# Altium footprint library smdComponent.PcbLib: 182 footprints (part 11 of 12)
Each footprint in its own frame and in the unit in brackets; x right, y up, seen from the top. Pads: shape width x height; smd on the part's side, far side on the other; paste and mask are expansions set on the pad; w line width, h text height; cw(c..) or ccw(c..) is an arc to the next point about the centre after c.
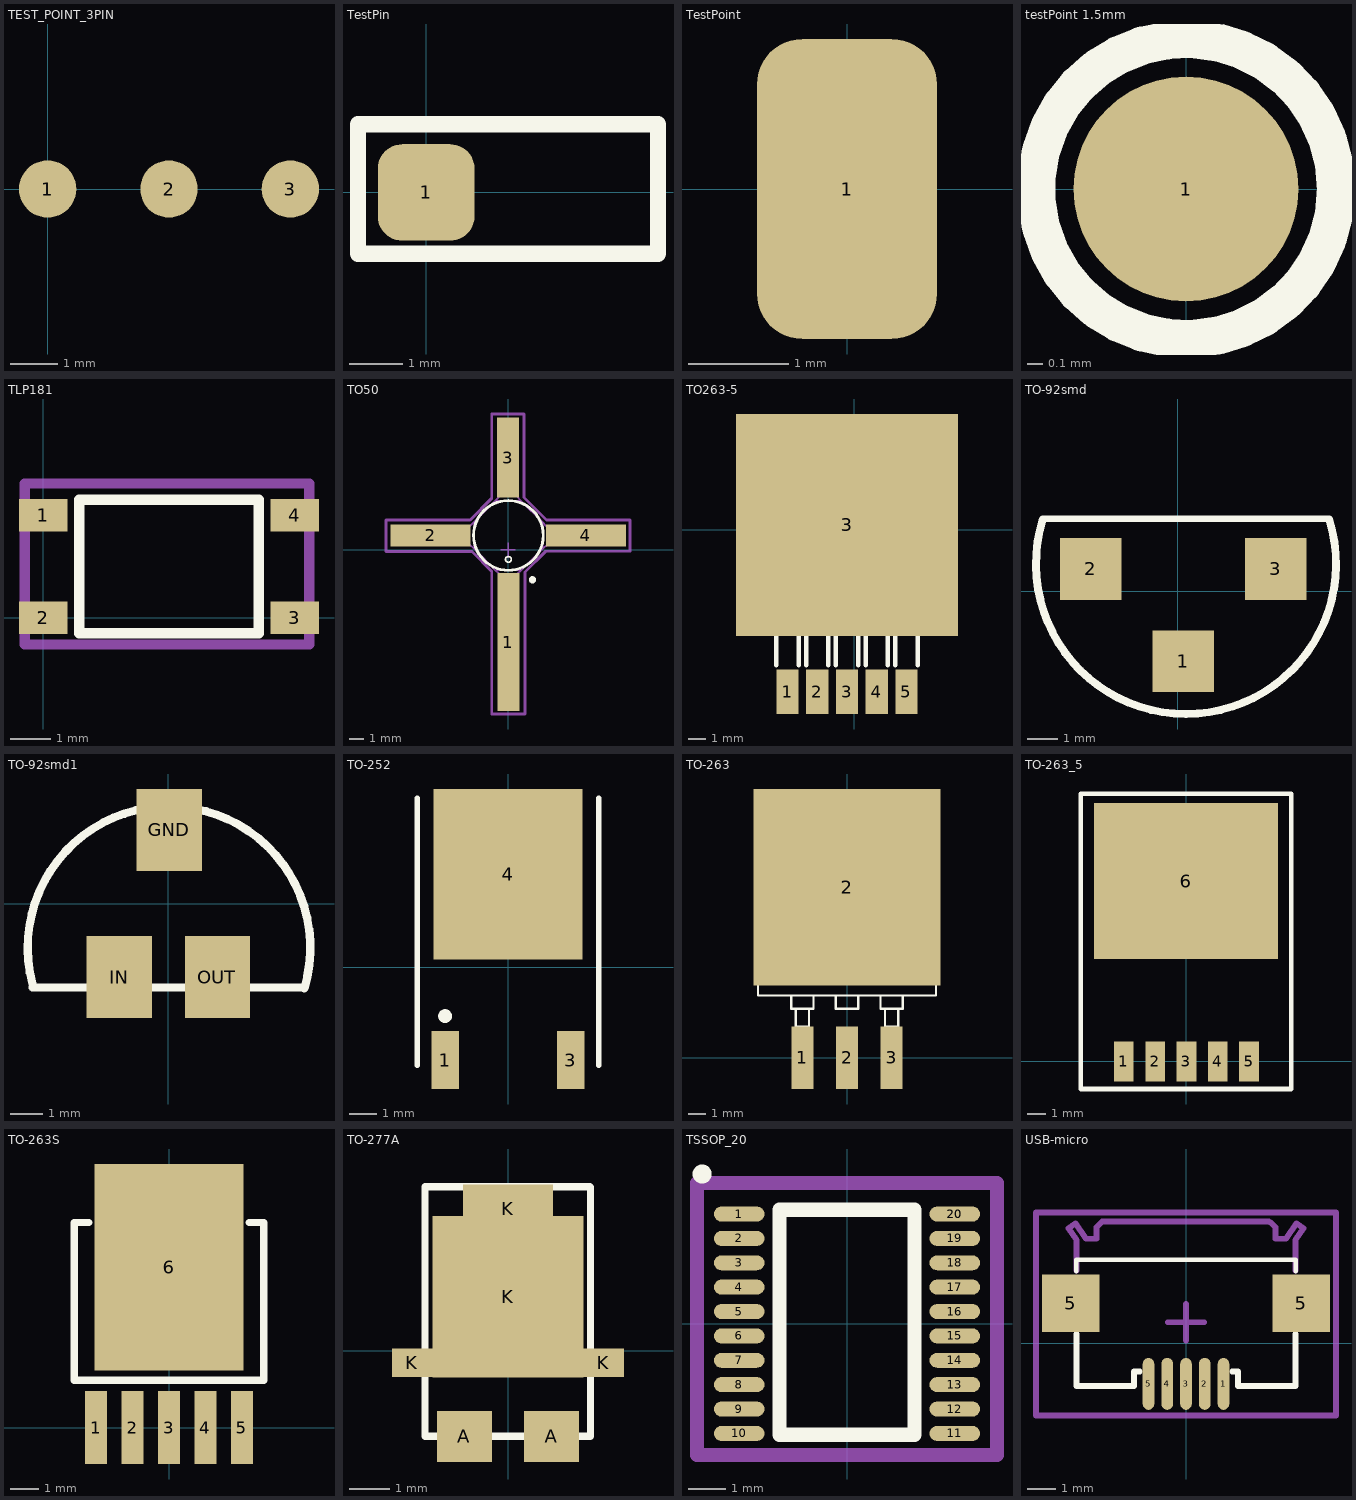
[diagram p10: the footprints below, top view; thin cyan lines are the x and y axes]

## TEST_POINT_3PIN [mm]
pads (3):
  round 1.2 smd: 1(0,0) 2(2.54,0) 3(5.08,0)

## TestPin [mm]
pads (1):
  rrect50% 1.8x1.8 smd: 1(0,0)
Top Overlay:
  lines w0.305: -1.27,-1.143 4.318,-1.143 4.318,1.27 -1.27,1.27 -1.27,-1.143
  text ".Comment" at 1.27,-0.254 h0.76

## TestPoint [mm]
pads (1):
  rrect50% 1.8x3 smd: 1(0,0)

## testPoint 1.5mm [mm]
pads (1):
  round 1.5 smd: 1(0,0)
Top Overlay:
  circle w0.254: c0,0 r1

## TLP181 [mm]
pads (4):
  rect 1.2x0.8 smd: 1(0,2.54) 2(0,0) 3(6.223,0) 4(6.223,2.54)
Top Overlay:
  lines w0.254: 0.889,-0.381 5.334,-0.381 5.334,2.921 0.889,2.921 0.889,-0.381
Mechanical 15:
  lines w0.254: -0.457,-0.66 -0.457,3.327 6.579,3.327 6.579,-0.66 -0.457,-0.66
3D body "User Library-PS2701_optocoupler.step": height 1.89, standoff -0.02, extent -0.427,-0.704 6.573,3.296

## TO50 [mm] "ERA, 4-Leads, Body 20.7x16.8mm,  Pitch 10.7mm"
height 2.5
pads (4):
  rect 1.5x9.5 smd: 1(0.013,-6.35)
  rect 5.5x1.5 smd: 2(-5.347,0.991) 4(5.347,0.991)
  rect 1.5x5.5 smd: 3(-0.013,6.35)
Top Overlay:
  circle w0.25: c1.669,-2.065 r0.125
  circle w0.1: c0.013,-0.66 r0.2
  circle w0.2: c0.013,0.991 r2.4
Mechanical 13:
  lines w0.1: -2.349,1.854 -2.349,0.076 ; -2.349,0.076 -0.876,-1.397 ; -2.349,0.076 -2.629,0.356 -7.07,0.356 -5.8,1.626 -2.654,1.626 -0.902,3.378 ; -0.902,3.378 0.876,3.378 ; -0.902,3.378 -0.66,3.619 -0.66,6.842 0.61,8.112 0.61,3.645 0.876,3.378 ; -0.876,-1.397 0.902,-1.397 ; -0.876,-1.397 -0.61,-1.664 -0.61,-10.13 0.635,-8.886 0.635,-1.664 0.902,-1.397 ; 0.876,3.378 2.375,1.88 ; 0.902,-1.397 2.4,0.102 2.426,0.102 ; 2.375,1.88 2.375,0.102 2.426,0.102 ; 2.375,1.88 2.629,1.626 7.426,1.626 7.426,0.356 2.68,0.356 2.426,0.102
Mechanical 15:
  lines w0.1: -0.5,0 0.5,0 ; 0,-0.5 0,0.5
  lines w0.2: -8.42,-0.127 -2.489,-0.127 -1.13,-1.486 -1.13,-2.083 -1.13,-11.303 1.156,-11.303 1.156,-1.537 2.591,-0.102 8.395,-0.102 8.395,2.057 2.629,2.057 1.079,3.607 1.079,9.347 -1.13,9.347 -1.13,3.543 -2.616,2.057 -8.42,2.057 -8.42,-0.127
3D body: height 2.5, standoff 0, extent -2.387,-1.409 2.412,3.39
3D body: height 1, standoff 0, extent 2.377,0.356 7.427,1.626
3D body: height 1, standoff 0, extent -0.61,-10.13 0.635,-1.397
3D body: height 1, standoff 0, extent -7.07,0.356 -2.349,1.626
3D body: height 1, standoff 0, extent -0.66,3.378 0.61,8.112
3D body: height 2.6, standoff 2.4, extent -0.187,-0.86 0.212,-0.461

## TO263-5 [mm]
pads (6):
  rect 1.27x2.54 smd: 1(-3.818,-9.27) 2(-2.116,-9.27) 3(-0.414,-9.27) 4(1.287,-9.27) 5(2.989,-9.27)
  rect 12.7x12.7 smd: 3(-0.414,0.28)
Top Overlay:
  lines w0.254: -4.453,-7.746 -4.453,-5.866 ; -3.183,-7.746 -3.183,-5.866 ; -2.751,-7.746 -2.751,-5.866 ; -1.481,-7.746 -1.481,-5.866 ; -1.049,-7.746 -1.049,-5.866 ; 0.221,-7.746 0.221,-5.866 ; 0.652,-7.746 0.652,-5.866 ; 1.922,-7.746 1.922,-5.866 ; 2.354,-7.746 2.354,-5.866 ; 3.624,-7.746 3.624,-5.866 ; -5.812,-5.866 4.983,-5.866 ; -5.812,-5.866 -5.812,4.548 ; -5.812,-5.866 -5.406,-5.46 ; -5.812,4.548 -5.812,5.36 -3.818,5.97 2.989,5.97 4.983,5.36 4.983,4.548 ; -5.812,4.548 -5.406,3.938 ; -5.812,4.548 4.983,4.548 ; -5.406,-5.46 4.577,-5.46 ; -5.406,-5.46 -5.406,3.938 ; -5.406,3.938 4.577,3.938 ; 4.577,-5.46 4.577,3.938 ; 4.577,-5.46 4.983,-5.866 ; 4.577,3.938 4.983,4.548 ; 4.983,-5.866 4.983,4.548
  text "1" at -4.074,-4.932 h0.89
  text "5" at 2.733,-4.932 h0.89
3D body "TO263-5S.STEP": height 4.81, standoff 0.01, extent -5.436,-10.045 4.564,5.625

## TO-92smd [mm]
pads (3):
  rect 2x2 smd: 1(0.178,-2.279) 2(-2.822,0.721) 3(3.178,0.721)
Top Overlay:
  lines w0.2: -4.382,2.351 4.918,2.351
  lines w0.254: -4.382,2.331 ccw(c0.267,0.882) 4.918,2.326

## TO-92smd1 [mm]
pads (3):
  rect 2x2.5 smd: GND(0.024,2.25) IN(-1.5,-2.25) OUT(1.5,-2.25)
Top Overlay:
  lines w0.254: -4.154,-2.565 4.157,-2.565 ; -4.154,-2.463 cw(c0.019,-1.35) 4.157,-2.585

## TO-252 [mm] "for LM7805CDT-smd"
pads (3):
  rect 1x2.1 smd: 1(-2.285,-3.375) 3(2.285,-3.375)
  rect 5.4x6.2 smd: 4(0,3.375)
Top Overlay:
  circle w0.25: c-2.285,-1.775 r0.125
  lines w0.2: -3.29,-3.568 -3.29,6.132 ; 3.29,-3.568 3.29,6.132
3D body "CircuitWorks-TO-252.step": height 2.3, standoff 0, extent -3.29,-3.568 3.29,6.132

## TO-263 [mil]
pads (4):
  rect 50x140 smd: 1(-100,0) 2(0,0) 3(100,0)
  rect 420x440.94 smd: 2(0,382.83)
Top Overlay:
  lines w5: -125,140 -125,110 -75,110 -75,140 ; -115,110 -115,70 -85,70 -85,110 ; -25,140 -25,110 25,110 25,140 ; 75,140 75,110 125,110 125,140 ; 85,110 85,70 115,70 115,110 ; -200,140 -200,520 -200,550 -170,565 170,565 200,550 200,520 200,140 -200,140
3D body "SW3dPS-TO263-3S.STEP": height 189.36, standoff 0.39, extent -195.21,-43.32 198.49,573.61

## TO-263_5 [mm]
pads (6):
  rect 1.07x2.16 smd: 1(-3.4,0) 2(-1.7,0) 3(0,0) 4(1.7,0) 5(3.4,0)
  rect 10x8.5 smd: 6(-0.025,9.804)
Top Overlay:
  lines w0.254: -5.74,-1.499 -5.74,14.554 5.69,14.554 5.69,-1.499 -5.74,-1.499
3D body "TO263-5S.STEP": height 4.81, standoff 0.01, extent -5.025,-1.064 4.975,14.606

## TO-263S [mil]
pads (6):
  rect 30x100 smd: 1(-100,0) 2(-50,0) 3(0,0) 4(50,0) 5(100,0)
  rect 204.72x283.46 smd: 6(0,220)
Top Overlay:
  lines w10: -109.92,281.54 -129.92,281.54 -129.92,65 129.92,65 129.92,281.54 109.92,281.54

## TO-277A [mm]
pads (6):
  rect 1.35x1.24 smd: A(-1.065,-2.096) A(1.065,-2.096)
  rect 1x0.7 smd: K(-2.337,-0.291) K(2.337,-0.291)
  rect 3.7x3.94 smd: K(0,1.321)
  rect 2.2x1.2 smd: K(0,3.468)
Top Overlay:
  lines w0.178: -2.032,4.013 -2.032,-2.092 2.018,-2.092 2.018,4.002 2.007,4.013 -1.981,4.013

## TSSOP_20 [mm]
pads (21):
  oval 1.35x0.4 smd: 1(-2.875,2.925) 2(-2.875,2.275) 3(-2.875,1.625) 4(-2.875,0.975) 5(-2.875,0.325) 6(-2.875,-0.325) 7(-2.875,-0.975) 8(-2.875,-1.625) 9(-2.875,-2.275) 10(-2.875,-2.925) 11(2.875,-2.925) 12(2.875,-2.275) 13(2.875,-1.625) 14(2.875,-0.975) 15(2.875,-0.325) 16(2.875,0.325) 17(2.875,0.975) 18(2.875,1.625) 19(2.875,2.275) 20(2.875,2.925) 20(2.875,2.925)
Top Overlay:
  circle w0.254: c-3.866,3.992 r0.127
  lines w0.381: -1.8,-2.962 0,-2.962 1.8,-2.962 1.8,0.038 1.8,3.038 0,3.038 -1.8,3.038 -1.8,0.038 -1.8,-2.962
Mechanical 15:
  lines w0.381: -4,-3.5 -3.75,-3.5 4,-3.5 4,3.75 -0.5,3.75 -4,3.75 -4,-3.5
3D body "tssop-20-1.step": height 1.2, standoff 0, extent -3.254,-3.298 3.346,3.302

## USB-micro [mm] "micro usb female smd"
pads (7):
  oval 0.4x1.8 smd: 1(1.3,-1.4) 2(0.65,-1.4) 3(0,-1.4) 4(-0.65,-1.4) 5(-1.3,-1.4)
  rect 2x2 smd: 5(-4,1.4) 5(4,1.4)
Top Overlay:
  lines w0.15: -3.8,2.5 -3.8,2.9 3.8,2.9 3.8,2.5
  lines w0.2: -3.8,0.33 -3.8,-0.17 -3.8,-1.47 -1.9,-1.47 -1.8,-1.47 -1.8,-0.97 -1.6,-0.97 ; 1.6,-0.97 1.8,-0.97 1.8,-1.47 1.9,-1.47 3.8,-1.47 3.8,-0.17 3.8,0.33
Mechanical 1:
  lines w0.1: -3.8,2.894 3.8,2.894
  lines w0.2: -3.8,2.53 -3.8,3.591 -4.078,3.992 -3.831,4.163 -3.462,3.63 -3.1,3.63 -3.1,4.03 -2.9,4.23 2.87,4.23 2.9,4.2 2.93,4.2 3.1,4.03 3.1,3.63 3.462,3.63 3.831,4.163 4.078,3.992 3.8,3.591 3.8,2.53
  text "PCB EDGE" at -2.413,3.148 h0.7
Mechanical 15:
  lines w0.2: -0.635,0.735 0.635,0.735 ; 0,0.1 0,1.37 ; -5.2,-2.5 -5.2,4.545 5.2,4.545 5.2,-2.5 -5.2,-2.5
3D body "65944.stEp": height 2.75, standoff -0.55, extent -4,-1.78 4,4.264